# Altium footprint library YQPOWER.PcbLib: 215 footprints (part 5 of 14)
Each footprint in its own frame and in the unit in brackets; x right, y up, seen from the top. Pads: shape width x height; smd on the part's side, far side on the other; paste and mask are expansions set on the pad; w line width, h text height; cw(c..) or ccw(c..) is an arc to the next point about the centre after c.
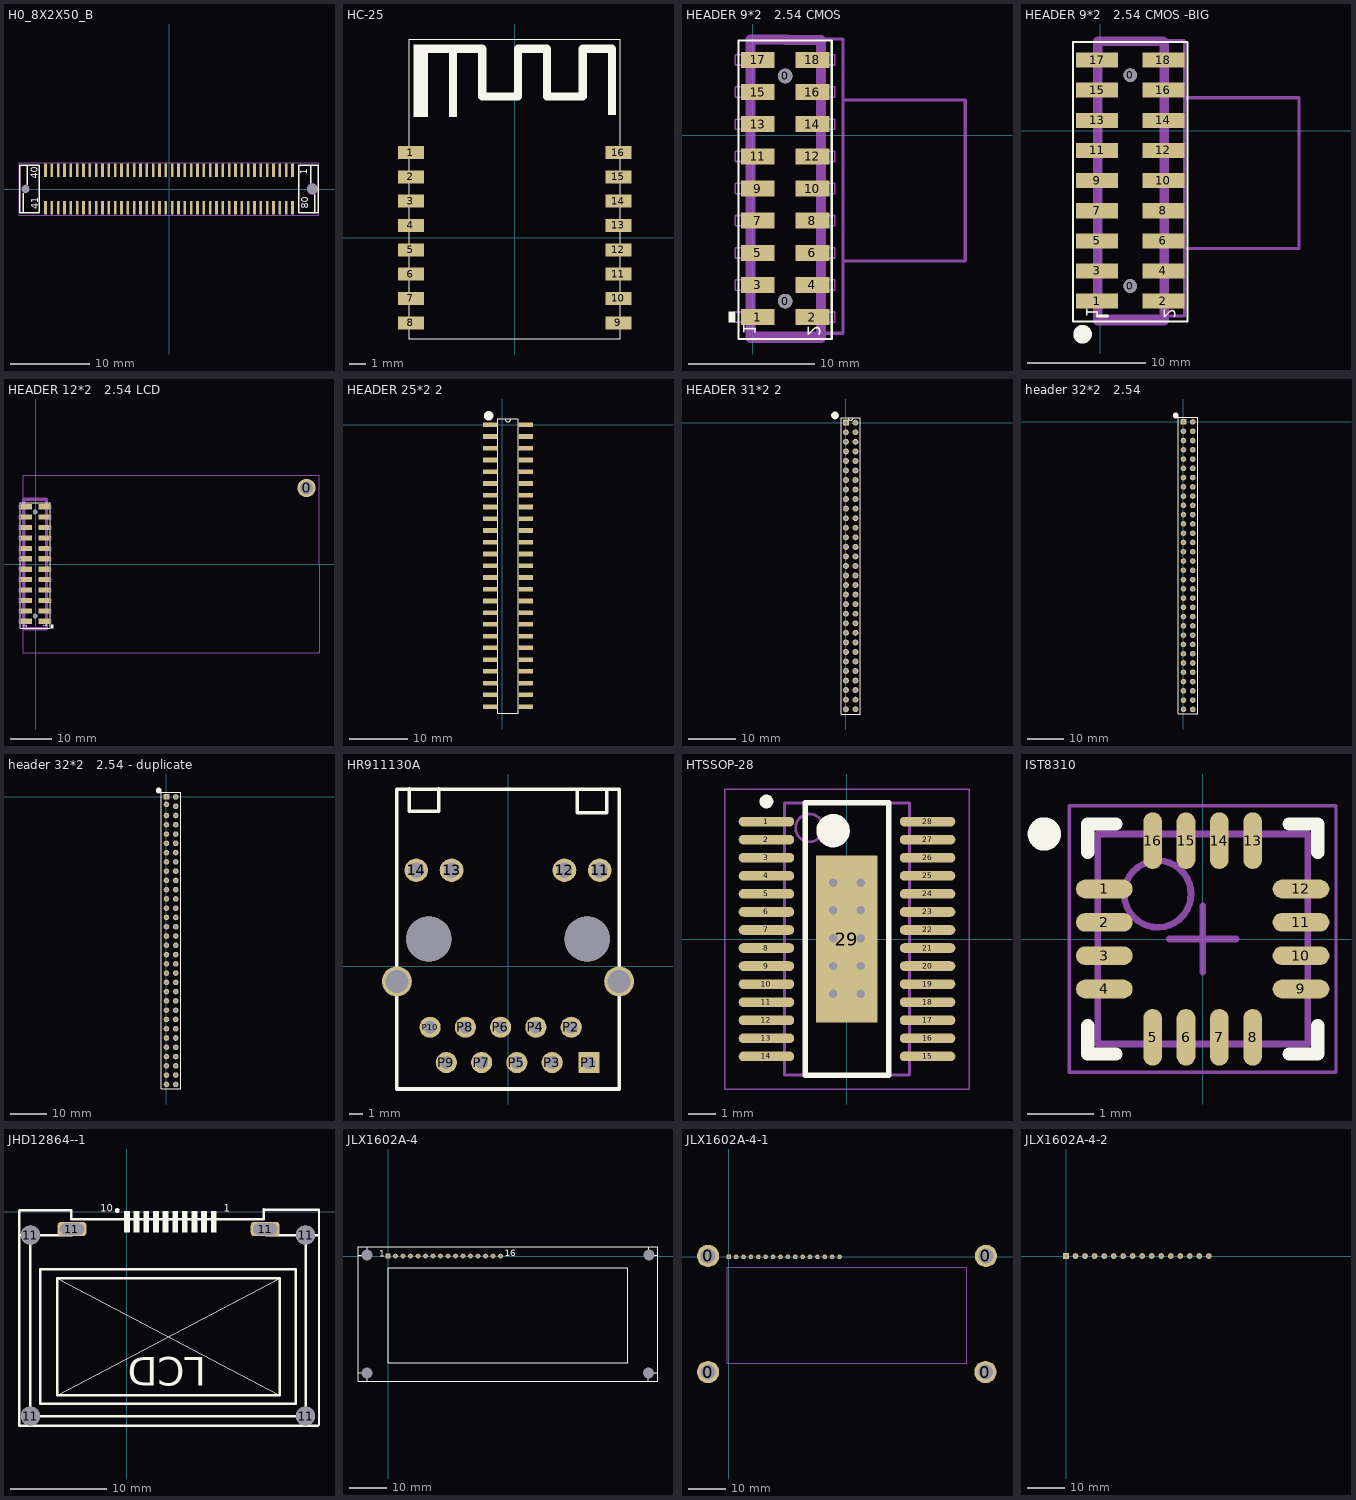
[diagram p4: the footprints below, top view; thin cyan lines are the x and y axes]

## H0_8X2X50_B [mm] "H0_8X2X50_B"
pads (82):
  rect 0.35x1.7 smd: 1(15.601,2.35) 2(14.801,2.35) 3(14,2.35) 4(13.2,2.35) 5(12.401,2.35) 6(11.6,2.35) 7(10.8,2.35) 8(10,2.35) 9(9.2,2.35) 10(8.401,2.35) 11(7.6,2.35) 12(6.8,2.35) 13(5.999,2.35) 14(5.199,2.35) 15(4.4,2.35) 16(3.599,2.35) 17(2.799,2.35) 18(1.999,2.35) 19(1.199,2.35) 20(0.4,2.35) 21(-0.401,2.35) 22(-1.201,2.35) 23(-2.001,2.35) 24(-2.801,2.35) 25(-3.6,2.35) 26(-4.4,2.35) 27(-5.201,2.35) 28(-6.001,2.35) 29(-6.801,2.35) 30(-7.6,2.35) 31(-8.401,2.35) 32(-9.201,2.35) 33(-10,2.35) 34(-10.801,2.35) 35(-11.6,2.35) 36(-12.401,2.35) 37(-13.201,2.35) 38(-14,2.35) 39(-14.801,2.35) 40(-15.6,2.35) 41(-15.6,-2.35) 42(-14.801,-2.35) 43(-14,-2.35) 44(-13.201,-2.35) 45(-12.401,-2.35) 46(-11.6,-2.35) 47(-10.801,-2.35) 48(-10,-2.35) 49(-9.201,-2.35) 50(-8.401,-2.35) 51(-7.6,-2.35) 52(-6.801,-2.35) 53(-6.001,-2.35) 54(-5.201,-2.35) 55(-4.4,-2.35) 56(-3.6,-2.35) 57(-2.801,-2.35) 58(-2.001,-2.35) 59(-1.201,-2.35) 60(-0.401,-2.35) 61(0.4,-2.35) 62(1.199,-2.35) 63(1.999,-2.35) 64(2.799,-2.35) 65(3.599,-2.35) 66(4.4,-2.35) 67(5.199,-2.35) 68(5.999,-2.35) 69(6.8,-2.35) 70(7.6,-2.35) 71(8.401,-2.35) 72(9.2,-2.35) 73(10,-2.35) 74(10.8,-2.35) 75(11.6,-2.35) 76(12.401,-2.35) 77(13.2,-2.35) 78(14,-2.35) 79(14.801,-2.35) 80(15.601,-2.35)
  round 0.9 hole 0.9: " "(-18.125,0)
  round 1.3 hole 1.3: " "(18.125,0)
Top Overlay:
  lines w0.178: -18.4,-3 -18.4,-0.55 ; -17.901,0.55 -17.901,3 ; -16.376,2.975 -16.376,-3 -18.876,-3 -18.876,3 -16.376,3 ; 17.9,0.75 17.9,3 ; 18.401,-3 18.401,-0.75 ; 16.375,-3 18.876,-3 18.876,3 16.375,3 16.375,-3
  text "40" at -16.566,1.308 h0.89
  text "41" at -16.54,-2.553 h0.89
  text "1" at 17.496,1.791 h0.89
  text "80" at 17.572,-2.476 h0.89
Mechanical 10:
  text "32" at 3.599,-1.842 h0.64
  text "28" at 5.199,-1.842 h0.64
  text "46" at -2.001,-1.842 h0.64
  text "24" at 6.8,-1.842 h0.64
  text "38" at 1.199,-1.842 h0.64
  text "44" at -1.201,-1.842 h0.64
  text "26" at 5.999,-1.842 h0.64
  text "40" at 0.4,-1.842 h0.64
  text "36" at 1.999,-1.842 h0.64
  text "42" at -0.401,-1.842 h0.64
  text "64" at -9.201,-1.842 h0.64
  text "65" at -10,2.858 h0.64
  text "67" at -10.801,2.858 h0.64
  text "72" at -12.401,-1.842 h0.64
  text "66" at -10,-1.842 h0.64
  text "68" at -10.801,-1.842 h0.64
  text "63" at -9.201,2.858 h0.64
  text "80" at -15.6,-1.842 h0.64
  text "47" at -2.801,2.858 h0.64
  text "48" at -2.801,-1.842 h0.64
  text "50" at -3.6,-1.842 h0.64
  text "25" at 5.999,2.858 h0.64
  text "27" at 5.199,2.858 h0.64
  text "78" at -14.801,-1.842 h0.64
  text "18" at 9.2,-1.842 h0.64
  text "20" at 8.401,-1.842 h0.64
  text "17" at 9.2,2.858 h0.64
  text "19" at 8.401,2.858 h0.64
  text "71" at -12.401,2.858 h0.64
  text "70" at -11.6,-1.842 h0.64
  text "69" at -11.6,2.858 h0.64
  text "77" at -14.801,2.858 h0.64
  text "79" at -15.6,2.858 h0.64
  text "59" at -7.6,2.858 h0.64
  text "29" at 4.4,2.858 h0.64
  text "41" at -0.401,2.858 h0.64
  text "61" at -8.401,2.858 h0.64
  text "45" at -2.001,2.858 h0.64
  text "39" at 0.4,2.858 h0.64
  text "23" at 6.8,2.858 h0.64
  text "31" at 3.599,2.858 h0.64
  text "57" at -6.801,2.858 h0.64
  text "43" at -1.201,2.858 h0.64
  text "21" at 7.6,2.858 h0.64
  text "35" at 1.999,2.858 h0.64
  text "37" at 1.199,2.858 h0.64
  text "60" at -7.6,-1.842 h0.64
  text "76" at -14,-1.842 h0.64
  text "49" at -3.6,2.858 h0.64
  text "73" at -13.201,2.858 h0.64
  text "53" at -5.201,2.858 h0.64
  text "74" at -13.201,-1.842 h0.64
  text "75" at -14,2.858 h0.64
  text "55" at -6.001,2.858 h0.64
  text "56" at -6.001,-1.842 h0.64
  text "51" at -4.4,2.858 h0.64
  text "33" at 2.799,2.858 h0.64
  text "34" at 2.799,-1.842 h0.64
  text "52" at -4.4,-1.842 h0.64
  text "30" at 4.4,-1.842 h0.64
  text "1" at 15.601,2.604 h0.64
  text "2" at 15.601,-2.096 h0.64
  text "3" at 14.801,2.604 h0.64
  text "4" at 14.801,-2.096 h0.64
  text "5" at 14,2.604 h0.64
  text "6" at 14,-2.096 h0.64
  text "54" at -5.201,-1.842 h0.64
  text "58" at -6.801,-1.842 h0.64
  text "22" at 7.6,-1.842 h0.64
  text "62" at -8.401,-1.842 h0.64
  text "15" at 10,2.858 h0.64
  text "16" at 10,-1.842 h0.64
  text "14" at 10.8,-1.842 h0.64
  text "8" at 13.2,-2.096 h0.64
  text "13" at 10.8,2.858 h0.64
  text "12" at 11.6,-1.842 h0.64
  text "11" at 11.6,2.858 h0.64
  text "10" at 12.401,-1.842 h0.64
  text "9" at 12.401,2.604 h0.64
  text "7" at 13.2,2.604 h0.64
Mechanical 14:
  circle w0.025: c-18.125,0 r0.45
  circle w0.025: c18.125,0 r0.65
Mechanical 15:
  lines w0.025: -18.952,-3.302 -18.952,3.302 18.952,3.302 18.952,-3.302 -18.952,-3.302
Mechanical 16:
  text ".Designator" at 13.901,-5.204 h0.64

## HC-25 [mm]
pads (16):
  rect 1.6x0.8 smd: 1(-6.4,5.25) 2(-6.4,3.75) 3(-6.4,2.25) 4(-6.4,0.75) 5(-6.4,-0.75) 6(-6.4,-2.25) 7(-6.4,-3.75) 8(-6.4,-5.25) 9(6.4,-5.25) 10(6.4,-3.75) 11(6.4,-2.25) 12(6.4,-0.75) 13(6.4,0.75) 14(6.4,2.25) 15(6.4,3.75) 16(6.4,5.25)
Top Overlay:
  region: -4.05,8.7 -4.05,7.45 -3.55,7.45 -3.55,8.7
  rectangle: 5.75,7.55 6.25,7.85
  region: -6.25,11.9 -6.25,7.45 -5.35,7.45 -5.35,11.9
  lines w0.025: -6.5,-6.25 6.5,-6.25 6.5,12.25 -6.5,12.25 -6.5,-6.25
  lines w0.5: -6,11.65 -2,11.65 -2,8.7 0.2,8.7 0.2,11.65 2,11.65 2,8.7 4.2,8.7 4.2,11.65 6,11.65 6,7.8 ; -3.8,8.7 -3.8,11.65

## HEADER 9*2   2.54 CMOS [mil]
pads (20):
  round 45.28 hole 45.28: 0(100,-515) 0(100,185)
  rect 105x50 smd: 1(15,-565) 2(185,-565) 3(15,-465) 4(185,-465) 5(15,-365) 6(185,-365) 7(15,-265) 8(185,-265) 9(15,-165) 10(185,-165) 11(15,-65) 12(185,-65) 13(15,35) 14(185,35) 15(15,135) 16(185,135) 17(15,235) 18(185,235)
Top Overlay:
  region: -57,-581.5 -75,-581.5 -75,-548.5 -57,-548.5
  lines w7: -45,-633 245,-633 245,295 -45,295 -45,-633
  text "2" at 170,-625 h40
  text "1" at -30,-620 h40
Mechanical 1:
  lines w31.5: 100,297.05 212.05,297.05 212.05,-630 92.95,-630 -7.95,-630 -7.95,297.95 105,297.95
Mechanical 5:
  lines w5: 2.5,-581 -55,-581 -55,-549 2.5,-549 ; 2.5,-481 -55,-481 -55,-449 2.5,-449 ; 2.5,-381 -55,-381 -55,-349 2.5,-349 ; 2.5,-281 -55,-281 -55,-249 2.5,-249 ; 2.5,-181 -55,-181 -55,-149 2.5,-149 ; 2.5,-81 -55,-81 -55,-49 2.5,-49 ; 2.5,19 -55,19 -55,51 2.5,51 ; 2.5,119 -55,119 -55,151 2.5,151 ; 2.5,219 -55,219 -55,251 2.5,251 ; 197.5,-581 255,-581 255,-549 197.5,-549 ; 197.5,-481 255,-481 255,-449 197.5,-449 ; 197.5,-381 255,-381 255,-349 197.5,-349 ; 197.5,-281 255,-281 255,-249 197.5,-249 ; 197.5,-181 255,-181 255,-149 197.5,-149 ; 197.5,-81 255,-81 255,-49 197.5,-49 ; 197.5,19 255,19 255,51 197.5,51 ; 197.5,119 255,119 255,151 197.5,151 ; 197.5,219 255,219 255,251 197.5,251
  lines w10: 280,-390 660,-390 660,110 280,110 ; -10,-615 -10,300 280,300 280,-615 -10,-615
  text "2" at -22,-595 h40
  text "1" at 253,-607 h40

## HEADER 9*2   2.54 CMOS -BIG [mil]
pads (20):
  round 45.28 hole 45.28: 0(100,-515) 0(100,185)
  rect 140x50 smd: 1(-10,-565) 2(210,-565) 3(-10,-465) 4(210,-465) 5(-10,-365) 6(210,-365) 7(-10,-265) 8(210,-265) 9(-10,-165) 10(210,-165) 11(-10,-65) 12(210,-65) 13(-10,35) 14(210,35) 15(-10,135) 16(210,135) 17(-10,235) 18(210,235)
Top Overlay:
  circle w30: c-58.38,-675 r15.81
  lines w7: -90,-633 290,-633 290,295 -90,295 -90,-633
  lines w10: -10,-615 25,-615
  text "2" at 210.93,-624.1 h40
  text "1" at -45.3,-620.47 h40
Mechanical 1:
  lines w31.5: 100,297.05 209,297.05 ; 105,297.95 -7.95,297.95 -7.95,-630 92.95,-630 212.05,-630 212.05,295
Mechanical 5:
  lines w5: 2.5,-581 -55,-581 -55,-549 2.5,-549 ; 2.5,-481 -55,-481 -55,-449 2.5,-449 ; 2.5,-381 -55,-381 -55,-349 2.5,-349 ; 2.5,-281 -55,-281 -55,-249 2.5,-249 ; 2.5,-181 -55,-181 -55,-149 2.5,-149 ; 2.5,-81 -55,-81 -55,-49 2.5,-49 ; 2.5,19 -55,19 -55,51 2.5,51 ; 2.5,119 -55,119 -55,151 2.5,151 ; 2.5,219 -55,219 -55,251 2.5,251 ; 197.5,-581 255,-581 255,-549 197.5,-549 ; 197.5,-481 255,-481 255,-449 197.5,-449 ; 197.5,-381 255,-381 255,-349 197.5,-349 ; 197.5,-281 255,-281 255,-249 197.5,-249 ; 197.5,-181 255,-181 255,-149 197.5,-149 ; 197.5,-81 255,-81 255,-49 197.5,-49 ; 197.5,19 255,19 255,51 197.5,51 ; 197.5,119 255,119 255,151 197.5,151 ; 197.5,219 255,219 255,251 197.5,251
  lines w10: 280,-390 660,-390 660,110 280,110 ; -10,-615 -10,300 280,300 280,-615 -10,-615
  text "2" at -22,-595 h40
  text "1" at 253,-607 h40

## HEADER 12*2   2.54 LCD [mil]
pads (27):
  round 45.28 hole 45.28: 0(-5,-500) 0(-5,500)
  round 177.17 hole 125.98: 0(2600,730)
  rect 105x50 smd: 1(80,-550) 2(-90,-550) 3(80,-450) 4(-90,-450) 5(80,-350) 6(-90,-350) 7(80,-250) 8(-90,-250) 9(80,-150) 10(-90,-150) 11(80,-50) 12(-90,-50) 13(80,50) 14(-90,50) 15(80,150) 16(-90,150) 17(80,250) 18(-90,250) 19(80,350) 20(-90,350) 21(80,450) 22(-90,450) 23(80,550) 24(-90,550)
Top Overlay:
  region: 168,-616.5 150,-616.5 150,-583.5 168,-583.5
  lines w7: -150,-618 140,-618 140,361 140,590 -150,590 -150,361 -150,-618
  text "1" at 110,-605 h40
  text "2" at -80,-610 h40
Mechanical 1:
  lines w31.5: -114,-622.05 -114,500 -114,622.05 -5,622.05 104,622.05 104,500 104,-622.05 -5,-622.05 -114,-622.05
Mechanical 5:
  lines w5: -102.5,-566 -160,-566 -160,-534 -102.5,-534 ; -102.5,-466 -160,-466 -160,-434 -102.5,-434 ; -102.5,-366 -160,-366 -160,-334 -102.5,-334 ; -102.5,-266 -160,-266 -160,-234 -102.5,-234 ; -102.5,-166 -160,-166 -160,-134 -102.5,-134 ; -102.5,-66 -160,-66 -160,-34 -102.5,-34 ; -102.5,34 -160,34 -160,66 -102.5,66 ; -102.5,134 -160,134 -160,166 -102.5,166 ; -102.5,234 -160,234 -160,266 -102.5,266 ; -102.5,334 -160,334 -160,366 -102.5,366 ; -102.5,434 -160,434 -160,466 -102.5,466 ; -102.5,534 -160,534 -160,566 -102.5,566 ; 92.5,-566 150,-566 150,-534 92.5,-534 ; 92.5,-466 150,-466 150,-434 92.5,-434 ; 92.5,-366 150,-366 150,-334 92.5,-334 ; 92.5,-266 150,-266 150,-234 92.5,-234 ; 92.5,-166 150,-166 150,-134 92.5,-134 ; 92.5,-66 150,-66 150,-34 92.5,-34 ; 92.5,34 150,34 150,66 92.5,66 ; 92.5,134 150,134 150,166 92.5,166 ; 92.5,234 150,234 150,266 92.5,266 ; 92.5,334 150,334 150,366 92.5,366 ; 92.5,434 150,434 150,466 92.5,466 ; 92.5,534 150,534 150,566 92.5,566
  lines w10: -125,-850 -125,850 2720,850 2720,-850 -125,-850
  text "1" at -160,-595 h40
  text "2" at 115,-580 h40

## HEADER 25*2 2 [mm]
pads (50):
  rect 2.5x0.8 smd: 1(-2.032,0) 2(4.064,0) 3(-2.032,-2) 4(4.064,-2) 5(-2.032,-4) 6(4.064,-4) 7(-2.032,-6) 8(4.064,-6) 9(-2.032,-8) 10(4.064,-8) 11(-2.032,-10) 12(4.064,-10) 13(-2.032,-12) 14(4.064,-12) 15(-2.032,-14) 16(4.064,-14) 17(-2.032,-16) 18(4.064,-16) 19(-2.032,-18) 20(4.064,-18) 21(-2.032,-20) 22(4.064,-20) 23(-2.032,-22) 24(4.064,-22) 25(-2.032,-24) 26(4.064,-24) 27(-2.032,-26) 28(4.064,-26) 29(-2.032,-28) 30(4.064,-28) 31(-2.032,-30) 32(4.064,-30) 33(-2.032,-32) 34(4.064,-32) 35(-2.032,-34) 36(4.064,-34) 37(-2.032,-36) 38(4.064,-36) 39(-2.032,-38) 40(4.064,-38) 41(-2.032,-40) 42(4.064,-40) 43(-2.032,-42) 44(4.064,-42) 45(-2.032,-44) 46(4.064,-44) 47(-2.032,-46) 48(4.064,-46) 49(-2.032,-48.006) 50(4.064,-48)
Top Overlay:
  circle w1: c-2.286,1.524 r0.3
  lines w0.2: -0.762,-49.149 2.794,-49.149 2.794,1 0.5,1 ccw(c1,1) 1.5,1 -0.762,1 -0.762,-49.149

## HEADER 31*2 2 [mm]
pads (62):
  rect 1.25x1.25 hole 0.75: 1(0,0)
  round 1.25 hole 0.75: 2(2,0) 3(0,-2) 4(2,-2) 5(0,-4) 6(2,-4) 7(0,-6) 8(2,-6) 9(0,-8) 10(2,-8) 11(0,-10) 12(2,-10) 13(0,-12) 14(2,-12) 15(0,-14) 16(2,-14) 17(0,-16) 18(2,-16) 19(0,-18) 20(2,-18) 21(0,-20) 22(2,-20) 23(0,-22) 24(2,-22) 26(2,-24) 27(0,-26) 28(2,-26) 29(0,-28) 30(2,-28) 31(0,-30) 32(2,-30) 33(0,-32) 34(2,-32) 35(0,-34) 36(2,-34) 37(0,-36) 38(2,-36) 39(0,-38) 40(2,-38) 41(0,-40) 42(2,-40) 43(0,-42) 44(2,-42) 45(0,-44) 46(2,-44) 47(0,-46) 48(2,-46) 49(0,-48) 50(2,-48) 51(0,-50) 52(2,-50) 53(0,-52) 54(2,-52) 55(0,-54) 56(2,-54) 57(0,-56) 58(2,-56) 59(0,-58) 60(2,-58) 61(0,-60) 62(2,-60)
  round 1.25 hole 0.75 unplated: 25(0,-24)
Top Overlay:
  circle w1: c-2.286,1.524 r0.3
  lines w0.2: -1.016,-61 3.048,-61 3.048,1 0.5,1 ccw(c1,1) 1.5,1 -1.016,1 -1.016,-61

## header 32*2   2.54 [mil]
pads (64):
  rect 60x60 hole 35: 1(0,0)
  round 60 hole 35: 2(100,0) 3(0,-100) 4(100,-100) 5(0,-200) 6(100,-200) 7(0,-300) 8(100,-300) 9(0,-400) 10(100,-400) 11(0,-500) 12(100,-500) 13(0,-600) 14(100,-600) 15(0,-700) 16(100,-700) 17(0,-800) 18(100,-800) 19(0,-900) 20(100,-900) 21(0,-1000) 22(100,-1000) 23(0,-1100) 24(100,-1100) 25(0,-1200) 26(100,-1200) 27(0,-1300) 28(100,-1300) 29(0,-1400) 30(100,-1400) 31(0,-1500) 32(100,-1500) 33(0,-1600) 34(100,-1600) 35(0,-1700) 36(100,-1700) 37(0,-1800) 38(100,-1800) 39(0,-1900) 40(100,-1900) 41(0,-2000) 42(100,-2000) 43(0,-2100) 44(100,-2100) 45(0,-2200) 46(100,-2200) 47(0,-2300) 48(100,-2300) 49(0,-2400) 50(100,-2400) 51(0,-2500) 52(100,-2500) 53(0,-2600) 54(100,-2600) 55(0,-2700) 56(100,-2700) 57(0,-2800) 58(100,-2800) 59(0,-2900) 60(100,-2900) 61(0,-3000) 62(100,-3000) 63(0,-3100) 64(100,-3100)
Top Overlay:
  circle w30: c-85,70 r15.81
  lines w10: 25,50 155,50 155,-3150 -55,-3150 -55,50 75,50

## header 32*2   2.54 - duplicate [mil]
pads (64):
  rect 60x60 hole 35: 1(0,0)
  round 60 hole 35: 2(100,0) 3(0,-80) 4(100,-100) 5(0,-200) 6(100,-200) 7(0,-300) 8(100,-300) 9(0,-400) 10(100,-400) 11(0,-500) 12(100,-500) 13(0,-600) 14(100,-600) 15(0,-700) 16(100,-700) 17(0,-800) 18(100,-800) 19(0,-900) 20(100,-900) 21(0,-1000) 22(100,-1000) 23(0,-1100) 24(100,-1100) 25(0,-1200) 26(100,-1200) 27(0,-1300) 28(100,-1300) 29(0,-1400) 30(100,-1400) 31(0,-1500) 32(100,-1500) 33(0,-1600) 34(100,-1600) 35(0,-1700) 36(100,-1700) 37(0,-1800) 38(100,-1800) 39(0,-1900) 40(100,-1900) 41(0,-2000) 42(100,-2000) 43(0,-2100) 44(100,-2100) 45(0,-2200) 46(100,-2200) 47(0,-2300) 48(100,-2300) 49(0,-2400) 50(100,-2400) 51(0,-2500) 52(100,-2500) 53(0,-2600) 54(100,-2600) 55(0,-2700) 56(100,-2700) 57(0,-2800) 58(100,-2800) 59(0,-2900) 60(100,-2900) 61(0,-3000) 62(100,-3000) 63(0,-3100) 64(100,-3100)
Top Overlay:
  circle w30: c-85,70 r15.81
  lines w10: 25,50 155,50 155,-3150 -55,-3150 -55,50 75,50

## HR911130A [mil]
pads (18):
  round 66.93 hole 43.31: 11(260,272.62) 12(160,272.62) 13(-160,272.62) 14(-260,272.62)
  rect 60x60 hole 35.83: P1(229.63,-272.62)
  round 60 hole 35.83: P2(179.1,-172.38) P3(125.2,-272.38) P4(79.1,-172.38) P5(25.2,-272.38) P6(-20.9,-172.38) P7(-74.8,-272.38) P8(-120.9,-172.38) P9(-174.8,-272.38) P10(-220.9,-172.38)
  round 85 hole 65: SHIELD0(-315,-42.48) SHIELD1(315,-42.48)
  round 127.95 hole 127.95 unplated: ""(-224.4,77.62) ""(224.4,77.62)
Top Overlay:
  lines w10: -279.53,502.82 -279.53,439.82 -196.85,439.82 -196.85,471.32 -196.85,502.82 ; 196.82,498.88 196.82,435.88 279.5,435.88 279.5,467.38 279.5,498.88 ; -315,-347.38 315,-347.38 315,502.62 -315,502.62 -315,-347.38

## HTSSOP-28 [mm] "TSOP, 28-Leads, Body 9.7x4.4mm, Pitch 0.65mm, IPC Low Density"
height 1.2
pads (29):
  oval 2x0.35 smd: 1(-2.9,4.225) 2(-2.9,3.575) 3(-2.9,2.925) 4(-2.9,2.275) 5(-2.9,1.625) 6(-2.9,0.975) 7(-2.9,0.325) 8(-2.9,-0.325) 9(-2.9,-0.975) 10(-2.9,-1.625) 11(-2.9,-2.275) 12(-2.9,-2.925) 13(-2.9,-3.575) 14(-2.9,-4.225) 15(2.9,-4.225) 16(2.9,-3.575) 17(2.9,-2.925) 18(2.9,-2.275) 19(2.9,-1.625) 20(2.9,-0.975) 21(2.9,-0.325) 22(2.9,0.325) 23(2.9,0.975) 24(2.9,1.625) 25(2.9,2.275) 26(2.9,2.925) 27(2.9,3.575) 28(2.9,4.225)
  rect 2.2x6 smd paste-1.575 mask+0.07: 29(-0.01,0)
via -0.5,-1.97 diameter 0.5 hole 0.3
via 0.5,-1.97 diameter 0.5 hole 0.3
via -0.5,-0.97 diameter 0.5 hole 0.3
via 0.5,-0.97 diameter 0.5 hole 0.3
via 0.5,0.03 diameter 0.5 hole 0.3
via -0.5,0.03 diameter 0.5 hole 0.3
via 0.5,1.03 diameter 0.5 hole 0.3
via -0.5,1.03 diameter 0.5 hole 0.3
via 0.5,2.03 diameter 0.5 hole 0.3
via -0.5,2.03 diameter 0.5 hole 0.3
Top Overlay:
  circle w0.6: c-0.5,3.9 r0.3
  circle w0.25: c-2.9,4.95 r0.125
  lines w0.2: -1.5,-4.9 1.5,-4.9 1.5,4.9 -1.5,4.9 -1.5,-4.9
Mechanical 5:
  circle w0.1: c-1.35,4 r0.5
  lines w0.1: -2.25,-4.9 2.25,-4.9 2.25,4.9 -2.25,4.9 -2.25,-4.9
  text ".Designator" at -1.854,-0.508 h1.02
Mechanical 15:
  lines w0.05: -4.4,-5.4 4.4,-5.4 4.4,5.4 -4.4,5.4 -4.4,-5.4
  lines w0.1: -0.5,0 0.5,0 ; 0,-0.5 0,0.5
3D body: height 1.2, standoff 0.05, extent -2.25,-4.9 2.25,4.9

## IST8310 [mm] "QFN, 16-Leads, Body 3x3mm, Pitch 0.5mm, Thermal Pad 1.45x1.45mm, TI Recommended"
height 1
pads (16):
  oval 0.85x0.28 smd paste-0.025 mask+0.07: 1(-1.475,0.75) 2(-1.475,0.25) 3(-1.475,-0.25) 4(-1.475,-0.75) 9(1.475,-0.75) 10(1.475,-0.25) 11(1.475,0.25) 12(1.475,0.75)
  oval 0.28x0.85 smd paste-0.025 mask+0.07: 5(-0.75,-1.475) 6(-0.25,-1.475) 7(0.25,-1.475) 8(0.75,-1.475) 13(0.75,1.475) 14(0.25,1.475) 15(-0.25,1.475) 16(-0.75,1.475)
Top Overlay:
  circle w0.25: c-2.375,1.575 r0.125
  lines w0.2: -1.725,-1.3 -1.725,-1.725 -1.3,-1.725 ; -1.725,1.3 -1.725,1.725 -1.3,1.725 ; 1.3,-1.725 1.725,-1.725 1.725,-1.3 ; 1.3,1.725 1.725,1.725 1.725,1.3
Mechanical 5:
  circle w0.1: c-0.675,0.675 r0.5
  lines w0.1: -1.575,-1.575 -1.575,1.575 1.575,1.575 1.575,-1.575 -1.575,-1.575
  text ".Designator" at -1.397,-1.016 h0.76
Mechanical 15:
  lines w0.05: -2,-2 -2,2 2,2 2,-2 -2,-2
  lines w0.1: -0.5,0 0.5,0 ; 0,-0.5 0,0.5
3D body: height 1, standoff 0, extent -1.575,-1.575 1.575,1.575

## JHD12864--1 [mm]
height 3.81
pads (16):
  rect 0.6x2.2 on Top Overlay: 1(0,-1.016) 2(1,-1.016) 3(2,-1.016) 4(3,-1.016) 5(4,-1.016) 6(5,-1.016) 7(6,-1.016) 8(7,-1.016) 9(8,-1.016) 10(9,-1.016)
  round 2 hole 2: 11(-10.033,-21.209) 11(-10.033,-2.413) 11(18.542,-21.209) 11(18.542,-2.413)
  rrect50% 3x1.5 hole 1.2 slot 2.5 at 0 deg: 11(-5.715,-1.778) 11(14.351,-1.778)
Top Overlay:
  circle w0.254: c-1.016,0.127 r0.127
  lines w0.127: -7.252,-19.05 15.875,-6.91 ; -7.252,-6.91 15.875,-19.05
  lines w0.254: -11.215,-2.413 -5.715,-2.413 ; -11.176,-22.225 19.824,-22.225 ; -11.176,-22.173 -11.176,0.127 -11.115,0.188 -5.776,0.188 -5.776,-0.762 14.224,-0.762 14.224,0.254 ; -10.033,-21.209 -10.033,-2.409 ; -9.958,-21.209 18.542,-21.209 18.542,-2.409 ; -9.017,-5.939 -9.017,-19.939 17.483,-19.939 ; -8.974,-5.939 17.526,-5.939 17.526,-19.939 ; -7.252,-6.91 -7.252,-19.05 15.748,-19.05 ; -7.125,-6.91 15.875,-6.91 15.875,-19.05 ; 14.276,0.202 19.939,0.202 19.939,-22.098 ; 14.439,-2.413 19.939,-2.413
  text "LCD" at 8.255,-14.097 h5.08
  text "1" at 10.033,-0.254 h1.27
  text "10" at -2.794,-0.254 h1.27

## JLX1602A-4 [mm]
pads (20):
  round 0 hole 3: 0(-5.588,-31.174) 0(-5.588,0.254) 0(69.469,-31.174) 0(69.596,0.254)
  rect 1.25x1.25 hole 0.75: 1(0,0)
  round 1.25 hole 0.75: 2(2,0) 3(4,0) 4(6,0) 5(8,0) 6(10,0) 7(12,0) 8(14,0) 9(16,0) 10(18,0) 11(20,0) 12(22,0) 14(26,0) 15(28,0) 16(30,0)
  round 1.25 hole 0.75 unplated: 13(24,0)
Top Overlay:
  lines w0.2: -8.001,-31.174 -5.588,-31.174 -5.588,-33.46 ; -8.001,0.254 -5.588,0.254 -5.588,2.54 ; 69.469,-33.46 69.469,-31.174 71.882,-31.174 ; 69.596,2.54 69.596,0.254 72.009,0.254 ; -8.001,-33.46 -8.001,2.54 71.999,2.54 71.999,-33.46 -8.001,-33.46 ; 0,-28.448 64,-28.448 64,-3.148 0,-3.148 0,-28.448
  text "1" at -2.286,-0.889 h3.05
  text "16" at 31.115,-0.762 h3.05

## JLX1602A-4-1 [mm]
pads (20):
  round 6 hole 4.1: 0(-5.588,-31.174) 0(-5.588,0.254) 0(69.469,-31.174) 0(69.596,0.254)
  rect 1.25x1.25 hole 0.75: 1(0,0)
  round 1.25 hole 0.75: 2(2,0) 3(4,0) 4(6,0) 5(8,0) 6(10,0) 7(12,0) 8(14,0) 9(16,0) 10(18,0) 11(20,0) 12(22,0) 14(26,0) 15(28,0) 16(30,0)
  round 1.25 hole 0.75 unplated: 13(24,0)
Bottom Overlay:
  lines w0.2: -8.001,-31.174 -5.588,-31.174 -5.588,-33.46 ; -8.001,0.254 -5.588,0.254 -5.588,2.54 ; 69.469,-33.46 69.469,-31.174 71.882,-31.174 ; 69.596,2.54 69.596,0.254 72.009,0.254 ; -8.001,-33.46 71.999,-33.46 71.999,2.54 -8.001,2.54 -8.001,-33.46 ; 0,-28.448 0,-3.148 64,-3.148 64,-28.448 0,-28.448
  text "16" at 34.163,-0.762 h3.05
  text "1" at -1.016,-0.889 h3.05
Mechanical 1:
  lines w0.254: -0.381,-28.829 -0.381,-2.794 64.389,-2.794 64.389,-25.654 64.389,-28.829 0.381,-28.829 -0.381,-28.829

## JLX1602A-4-2 [mil]
pads (16):
  rect 60x60 hole 35: 1(0,0)
  round 60 hole 35: 2(100,0) 3(200,0) 4(300,0) 5(400,0) 6(500,0) 7(600,0) 8(700,0) 9(800,0) 10(900,0) 11(1000,0) 12(1100,0) 13(1200,0) 14(1300,0) 15(1400,0) 16(1500,0)
Bottom Overlay:
  lines w7.87: -315,-1227.32 -220,-1227.32 -220,-1317.32 ; -315,10 -220,10 -220,100 ; 2735,-1317.32 2735,-1227.32 2830,-1227.32 ; 2740,100 2740,10 2835,10 ; -315,-1317.32 2834.61,-1317.32 2834.61,100 -315,100 -315,-1317.32 ; -150,-1145 -150,-100 2685,-100 2685,-1145 -150,-1145
  text "16" at 1675,-35 h120
  text "1" at -40,-35 h120